# Altium integrated library ESP8266-Deskop_Power.IntLib: 35 symbols
Pins are listed as number, name and electrical type; pins without a type are passive.

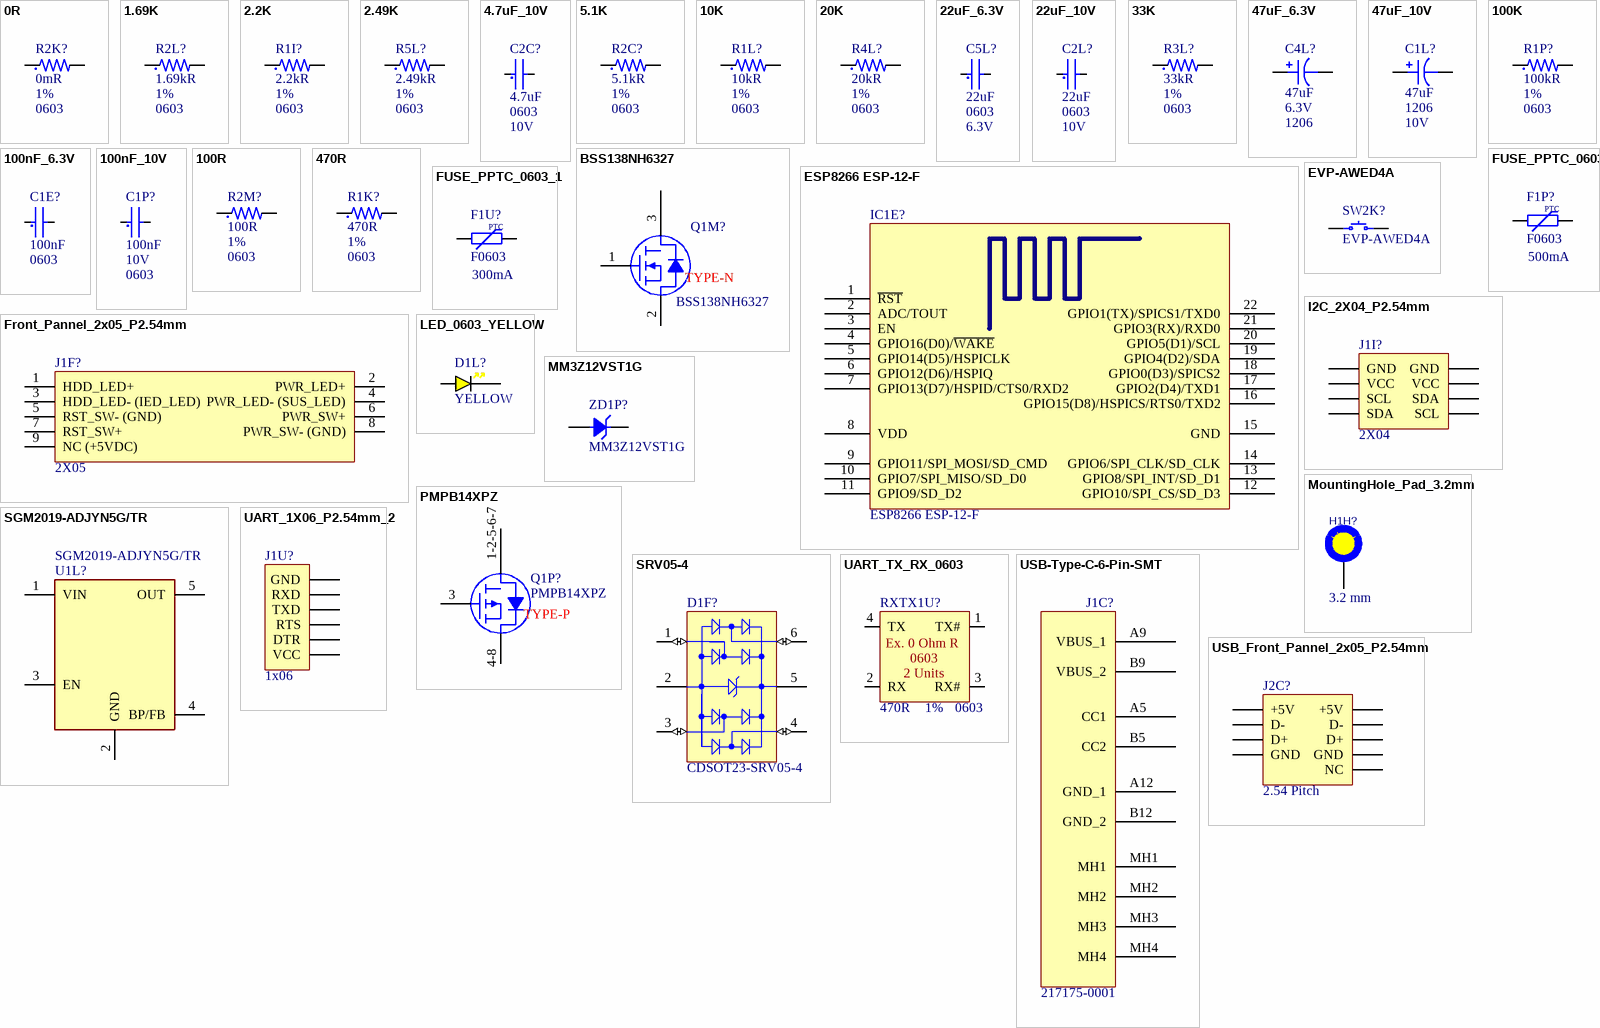
[diagram p0: symbols 0R to USB_Front_Pannel_2x05_P2.54mm]

## 0R
designator R2K?, comment value 0mR  Tolerance: 1%  Case/Package: 0603  (hidden comment: RC0603JR-070RL)
Zero Ohm Resistor, Jumper, 0603 [1608 Metric], Thick Film, 100 mW, 1 A, Surface Mount; Manufacturer: Yageo; Temperature Coefficient: 200ppm/°C; Power Rating: 100mW; Voltage Rating (DC): 50V; Resistance Tolerance: 5%; Supplier 1: Future Electronics; Manufacturer Part Number: RC0603JR-070RL; RoHS: Yes; Category: Chip SMD Resistors; Stock 1: 16355000; Pricing 1: 5000=0.0015, 50000=0.0014, 150000=0.0014, 375000=0.0013, 1000000=0.0012 (USD); Pins: 2; Case Code (Imperial): 0603; Case Code (Metric): 1608; Contact Plating: Tin,Matte; Min Operating Temperature: -55°C; Max Operating Temperature: 155°C; Packaging: Tape and Reel; Series: RC; Package Quantity: 5000; Termination: SMD/SMT; Voltage Rating: 50V; Resistor Type: Thick Film; Features: Moisture Resistant; Max Power Dissipation: 100mW; Number of Terminations: 2; Construction: Rectangular; Technology: THICK FILM; Length: 1.6mm; Width: 0.8mm; Height: 0.45mm; Depth: 0.8mm; RoHS Compliant: Yes; Reach SVHC Compliant: Unknown; Lead Free: 5697LeadFree; Military Standard: Not; Supplier Part Number 1: 3992146
footprint R0603-IPC_A
footprint R0603-IPC_B
footprint R0603-MFG
footprint R0603-IPC_C
footprint R0603-MFG_No_Silk
footprint R0603-IPC_C_No_Silk
footprint R0603-IPC_B_No_Silk
footprint R0603-IPC_A_No_Silk
pins: 1, 2

## 1.69K
designator R2L?, comment value 1.69kR  Tolerance: 1%  Case/Package: 0603  (hidden comment: MCR03EZPFX1691)
Surface Mount Thick Film Chip Resistor 0603 Case 1.69K Ohms 1% Tolerance 100 PPM; Manufacturer: Rohm; Power Rating: 100mW; Temperature Coefficient: 100ppm/°C; Voltage Rating (DC): 50V; Supplier 1: Quest; Manufacturer Part Number: MCR03EZPFX1691; RoHS: Yes; Category: Chip SMD Resistors; Stock 1: 11347; Pricing 1: 1=0.0232, 217=0.0145, 1380=0.0087, 5748=0.0044 (USD); Case Code (Imperial): 0603; Case Code (Metric): 1608; Min Operating Temperature: -55°C; Max Operating Temperature: 155°C; Packaging: Cut Tape; Number of Terminations: 2; Max Power Dissipation: 100mW; Features: Automotive AEC-Q200; Series: MCR03; Lead Free: Lead Free; RoHS Compliant: Yes; Supplier Part Number 1: MCR03EZPFX1691; Package Quantity: 1; Length: 0.063inch; Width: 0.031inch; Height: 0.022inch; Mounting Technology: Surface Mount; ComponentLink1URL: http://rohmfs.rohm.com/en/products/databook/datasheet/passive/resistor/chip_resistor/mcr.pdf?src-supplier=Avnet; ComponentLink1Description: http://rohmfs.rohm.com/en/products/databook/datasheet/passive/resistor/chip_resistor/mcr.pdf?src-supplier=Avnet; ComponentLink2URL: http://www.rohm.com/web/global/datasheet/MCR03EZPFX/mcr-e?src-supplier=Digikey; ComponentLink2Description: http://www.rohm.com/web/global/datasheet/MCR03EZPFX/mcr-e?src-supplier=Digikey
footprint R0603-IPC_A
footprint R0603-IPC_A_No_Silk
footprint R0603-IPC_B
footprint R0603-IPC_B_No_Silk
footprint R0603-IPC_C
footprint R0603-IPC_C_No_Silk
footprint R0603-MFG
footprint R0603-MFG_No_Silk
pins: 1, 2

## 2.2K
designator R1I?, comment value 2.2kR  Tolerance: 1%  Case/Package: 0603  (hidden comment: RC0603FR-072K2L)
SMD Chip Resistor, 2.2 kOhm, ± 1%, 100 mW, 0603 [1608 Metric], Thick Film, General Purpose; Manufacturer: Yageo; Power Rating: 100mW; Voltage Rating: 50V; Temperature Coefficient: 100ppm/°C; Supplier 1: Future Electronics; Manufacturer Part Number: RC0603FR-072K2L; RoHS: Yes; Category: Chip SMD Resistors; Stock 1: 6755000; Pricing 1: 5000=0.0026, 75000=0.001, 100000=0.0024, 200000=0.001, 375000=0.0023, 500000=0.0009, 1250000=0.0022, 5000000=0.002 (USD); Case Code (Imperial): 0603; Case Code (Metric): 1608; Min Operating Temperature: -55°C; Max Operating Temperature: 155°C; Packaging: Tape and Reel; Resistor Type: Thick Film; Number of Terminations: 2; Max Power Dissipation: 100mW; Features: Moisture Resistant; Series: RC; Resistance Tolerance: 1%; Lead Free: Lead Free; RoHS Compliant: Yes; Reach SVHC Compliant: Unknown; ComponentLink1URL: https://datasheet.ciiva.com/2453/pyu-r-int-thick-7-2453943.pdf?src-supplier=Digikey; ComponentLink1Description: https://datasheet.ciiva.com/2453/pyu-r-int-thick-7-2453943.pdf?src-supplier=Digikey; ComponentLink2URL: https://datasheet.ciiva.com/2453/pyu-r-int-thick-7-2453944.pdf?src-supplier=Digikey; ComponentLink2Description: https://datasheet.ciiva.com/2453/pyu-r-int-thick-7-2453944.pdf?src-supplier=Digikey; ComponentLink3URL: https://datasheet.ciiva.com/2453/pyu-r-int-thick-7-2453945.pdf?src-supplier=Digikey; ComponentLink3Description: https://datasheet.ciiva.com/2453/pyu-r-int-thick-7-2453945.pdf?src-supplier=Digikey; ComponentLink4URL: https://datasheet.ciiva.com/7660/1868787-7660791.pdf?src-supplier=Element14; ComponentLink4Description: https://datasheet.ciiva.com/7660/1868787-7660791.pdf?src-supplier=Element14; ComponentLink5URL: https://datasheet.ciiva.com/46394/443971-46394958.pdf?src-supplier=Element14; ComponentLink5Description: https://datasheet.ciiva.com/46394/443971-46394958.pdf?src-supplier=Element14; Supplier Part Number 1: 6372452
footprint R0603-IPC_A
footprint R0603-IPC_B
footprint R0603-IPC_C
footprint R0603-MFG
footprint R0603-MFG_No_Silk
footprint R0603-IPC_C_No_Silk
footprint R0603-IPC_B_No_Silk
footprint R0603-IPC_A_No_Silk
pins: 1, 2

## 2.49K
designator R5L?, comment value 2.49kR  Tolerance: 1%  Case/Package: 0603  (hidden comment: MCR03EZPFX2491)
Res Thick Film 0603 2.49K Ohm 1% 1/10W ±100ppm/°C Molded SMD SMD Paper T/R; Manufacturer: Rohm; Power Rating: 100mW; Voltage Rating (DC): 50V; Supplier 1: One Stop Electro; Manufacturer Part Number: MCR03EZPFX2491; RoHS: Yes; Category: Chip SMD Resistors; Stock 1: 683; Pricing 1: 1=0.036, 10=0.031, 100=0.031, 1000=0.028 (USD); Case Code (Imperial): 0603; Case Code (Metric): 1608; Min Operating Temperature: -55°C; Max Operating Temperature: 155°C; Packaging: Cut Tape; Number of Terminations: 2; Temperature Coefficient: 100ppm/°C; Max Power Dissipation: 100mW; Features: Automotive AEC-Q200; Series: MCR03; Lead Free: Lead Free; RoHS Compliant: Yes; ComponentLink1URL: https://datasheet.ciiva.com/2520/mcr-2520347.pdf?src-supplier=Digikey; ComponentLink1Description: https://datasheet.ciiva.com/2520/mcr-2520347.pdf?src-supplier=Digikey; ComponentLink2URL: https://datasheet.ciiva.com/2520/mcr-2520348.pdf?src-supplier=Digikey; ComponentLink2Description: https://datasheet.ciiva.com/2520/mcr-2520348.pdf?src-supplier=Digikey; ComponentLink3URL: https://datasheet.ciiva.com/2520/mcr-2520349.pdf?src-supplier=Digikey; ComponentLink3Description: https://datasheet.ciiva.com/2520/mcr-2520349.pdf?src-supplier=Digikey; ComponentLink4URL: https://datasheet.ciiva.com/16203/mcr03ezpd-16203167.pdf?src-supplier=Future+Electronics; ComponentLink4Description: https://datasheet.ciiva.com/16203/mcr03ezpd-16203167.pdf?src-supplier=Future+Electronics; Supplier Part Number 1: 53268691; Mounting Technology: Surface Mount; Contact Plating: Tin; Package Quantity: 1; Length: 0.063inch; Width: 0.031inch; Height: 0.022inch
footprint R0603-MFG
footprint R0603-IPC_C
footprint R0603-IPC_B
footprint R0603-IPC_A
footprint R0603-MFG_No_Silk
footprint R0603-IPC_C_No_Silk
footprint R0603-IPC_B_No_Silk
footprint R0603-IPC_A_No_Silk
pins: 1, 2

## 4.7uF_10V
designator C2C?, comment value 4.7uF  Case Code (Imperial): 0603  Voltage Rating: 10V  (hidden comment: CL10A475KP8NNNC)
Multilayer Ceramic Capacitor, 4.7 uF, 10 V, ± 10%, X5R, 0603 [1608 Metric]; Manufacturer: Samsung; Supplier 1: Verical; Manufacturer Part Number: CL10A475KP8NNNC; RoHS: Yes; Category: Ceramic Capacitors; Mounting Technology: Surface Mount; Case/Package: 0603; Case Code (Metric): 1608; Min Operating Temperature: -55°C; Max Operating Temperature: 85°C; Packaging: Tape and Reel; Tolerance: 10%; Series: CL; Length: 1.6mm; Width: 0.031inch; RoHS Compliant: Yes; Supplier Part Number 1: CL10A475KP8NNNC; Stock 1: 412000; Pricing 1: 4000=0.0042 (USD); Package Quantity: 1; Voltage Rating (DC): 10V; Dielectric: X5R; Construction: Flat; Height: 0.8mm; Depth: 0.8mm; Thickness: 0.035inch; Radiation Hardening: No
footprint C0603-IPC_A
footprint C0603-IPC_B
footprint C0603-IPC_C
footprint C0603-MFG
footprint C0603-MFG_No_Silk
footprint C0603-IPC_C_No_Silk
footprint C0603-IPC_B_No_Silk
footprint C0603-IPC_A_No_Silk
pins: 1, 2

## 5.1K
designator R2C?, comment value 5.1kR  Tolerance: 1%  Case/Package: 0603  (hidden comment: CRCW06035K10FKEA)
SMD Chip Resistor, 5.1 kOhm, ± 1%, 100 mW, 0603 [1608 Metric], Thick Film, General Purpose; Manufacturer: Vishay; Temperature Coefficient: 100ppm/°C; Max Power Dissipation: 100mW; Voltage Rating: 75V; Supplier 1: Mouser; Manufacturer Part Number: CRCW06035K10FKEA; RoHS: Yes; Category: Chip SMD Resistors; Stock 1: 43654; Pricing 1: 1=0.1, 10=0.034, 50=0.034, 100=0.014, 1000=0.008, 10000=0.004 (USD); Case Code (Imperial): 0603; Case Code (Metric): 1608; Min Operating Temperature: -55°C; Max Operating Temperature: 155°C; Packaging: Tape and Reel; Series: CRCW; Number of Terminations: 2; Voltage Rating (DC): 75V; Package Quantity: 5000; Length: 1.55mm; Width: 0.85mm; Height: 0.45mm; RoHS Compliant: Yes; ComponentLink1URL: https://datasheet.ciiva.com/11809/0900766b80d98afc-11809935.pdf?src-supplier=Rs; ComponentLink1Description: https://datasheet.ciiva.com/11809/0900766b80d98afc-11809935.pdf?src-supplier=Rs; ComponentLink2URL: https://datasheet.ciiva.com/7690/1720486-7690873.pdf?src-supplier=Element14; ComponentLink2Description: https://datasheet.ciiva.com/7690/1720486-7690873.pdf?src-supplier=Element14; ComponentLink3URL: https://datasheet.ciiva.com/15159/getdatasheetpartid-32793-15159338.pdf?src-supplier=Verical; ComponentLink3Description: https://datasheet.ciiva.com/15159/getdatasheetpartid-32793-15159338.pdf?src-supplier=Verical; Supplier Part Number 1: 71-CRCW0603-5.1K-E3; Weight: 7.1E-05oz; Contact Plating: Tin; Features: Automotive AEC-Q200; Power Rating: 100mW; Termination: SMD/SMT; Resistor Type: Thick Film; Construction: Rectangular; Resistance Tolerance: 1%; Technology: THICK FILM; Depth: 0.85mm; Radiation Hardening: No; Lead Free: 5697LeadFree; Military Standard: Not; Reach SVHC Compliant: Unknown; ComponentLink4URL: https://datasheet.ciiva.com/26314/fld-crcw-e3-data-en-26314742.pdf?src-supplier=Distrelec; ComponentLink4Description: https://datasheet.ciiva.com/26314/fld-crcw-e3-data-en-26314742.pdf?src-supplier=Distrelec; ComponentLink5URL: https://datasheet.ciiva.com/7690/1697337-7690728.pdf?src-supplier=Element14; ComponentLink5Description: https://datasheet.ciiva.com/7690/1697337-7690728.pdf?src-supplier=Element14; ComponentLink6URL: https://datasheet.ciiva.com/3257/dcrcwe3-3257758.pdf?src-supplier=Avnet; ComponentLink6Description: https://datasheet.ciiva.com/3257/dcrcwe3-3257758.pdf?src-supplier=Avnet; ComponentLink7URL: https://datasheet.ciiva.com/16226/dcrcwe3-16226862.pdf?src-supplier=Future+Electronics; ComponentLink7Description: https://datasheet.ciiva.com/16226/dcrcwe3-16226862.pdf?src-supplier=Future+Electronics
footprint R0603-IPC_A
footprint R0603-IPC_B
footprint R0603-IPC_C
footprint R0603-MFG
footprint R0603-MFG_No_Silk
footprint R0603-IPC_C_No_Silk
footprint R0603-IPC_B_No_Silk
footprint R0603-IPC_A_No_Silk
pins: 1, 2

## 10K
designator R1L?, comment value 10kR  Tolerance: 1%  Case/Package: 0603  (hidden comment: RC0603FR-0710KL)
SMD Chip Resistor, 10 kOhm, ± 1%, 100 mW, 0603 [1608 Metric], Thick Film, General Purpose; Manufacturer: Yageo; Power Rating: 100mW; Temperature Coefficient: 100ppm/°C; Voltage Rating (DC): 50V; Voltage Rating: 75V; Supplier 1: Future Electronics; Manufacturer Part Number: RC0603FR-0710KL; RoHS: Yes; Category: Chip SMD Resistors; Stock 1: 44660000; Pricing 1: 5000=0.0015, 50000=0.0014, 150000=0.0014, 375000=0.0013, 1000000=0.0012 (USD); Case Code (Imperial): 0603; Case Code (Metric): 1608; Min Operating Temperature: -55°C; Max Operating Temperature: 155°C; Packaging: Tape and Reel; Number of Terminations: 2; Max Power Dissipation: 100mW; Features: Moisture Resistant; Series: RC; Lead Free: 5697LeadFree; RoHS Compliant: Yes; Supplier Part Number 1: 4023214; Length: 1.6mm; Width: 0.8mm; Height: 0.45mm; Pins: 2; Weight: 7.1E-05oz; Resistance Tolerance: 1%; Termination: SMD/SMT; Resistor Type: Thick Film; Construction: Rectangular; Depth: 0.8mm; Lead Pitch: 0.3mm; Reach SVHC Compliant: No; Military Standard: Not
footprint R0603-IPC_A
footprint R0603-IPC_B
footprint R0603-IPC_C
footprint R0603-MFG
footprint R0603-MFG_No_Silk
footprint R0603-IPC_C_No_Silk
footprint R0603-IPC_B_No_Silk
footprint R0603-IPC_A_No_Silk
pins: 1, 2

## 20K
designator R4L?, comment value 20kR  Tolerance: 1%  Case/Package: 0603  (hidden comment: CR0603-FX-2002ELF)
SMD Chip Resistor, 20 kOhm, ± 1%, 100 mW, 0603 [1608 Metric], Thick Film, General Purpose; Manufacturer: Bourns; Power Rating: 100mW; Temperature Coefficient: 100ppm/°C; Voltage Rating (DC): 50V; Supplier 1: Onlinecomponents.com; Manufacturer Part Number: CR0603-FX-2002ELF; RoHS: Yes; Category: Chip SMD Resistors; Stock 1: 20000; Pricing 1: 20000=0.0014, 40000=0.0013, 80000=0.0013, 160000=0.0012 (USD); Case Code (Imperial): 0603; Case Code (Metric): 1608; Min Operating Temperature: -55°C; Max Operating Temperature: 155°C; Packaging: Tape and Reel; Number of Terminations: 2; Max Power Dissipation: 100mW; Features: Moisture Resistant; Series: CR0603; RoHS Compliant: Yes; ComponentLink1URL: https://datasheet.ciiva.com/11809/0900766b80fcdb72-11809666.pdf?src-supplier=Rs; ComponentLink1Description: https://datasheet.ciiva.com/11809/0900766b80fcdb72-11809666.pdf?src-supplier=Rs; ComponentLink2URL: https://datasheet.ciiva.com/9121/chpreztr-9121928.pdf?src-supplier=Avnet; ComponentLink2Description: https://datasheet.ciiva.com/9121/chpreztr-9121928.pdf?src-supplier=Avnet; Supplier Part Number 1: CR0603-FX-2002ELF; Mounting Technology: Surface Mount; Contact Plating: Tin; Package Quantity: 1; Length: 1.6mm; Width: 0.8mm; Height: 0.45mm; Voltage Rating: 50V; Resistor Type: Thick Film; Termination: SMD/SMT; Resistance Tolerance: 1%; Technology: THICK FILM; Depth: 0.8mm; Thickness: 457um; Radiation Hardening: No; Reach SVHC Compliant: No
footprint R0603-IPC_A
footprint R0603-IPC_B
footprint R0603-IPC_C
footprint R0603-MFG
footprint R0603-MFG_No_Silk
footprint R0603-IPC_C_No_Silk
footprint R0603-IPC_B_No_Silk
footprint R0603-IPC_A_No_Silk
pins: 1, 2

## 22uF_6.3V
designator C5L?, comment value 22uF  Case/Package: 0603  Voltage Rating: 6.3V  (hidden comment: GRM188R60J226MEA0D)
Multilayer Ceramic Capacitor, 22 uF, 6.3 V, ± 20%, X5R, 0603 [1608 Metric]; Manufacturer: Murata; Material: 4241ConductorMaterial; Supplier 1: Mouser; Manufacturer Part Number: GRM188R60J226MEA0D; RoHS: Yes; Category: Ceramic Capacitors; Stock 1: 856547; Pricing 1: 1=0.2, 10=0.078, 50=0.078, 100=0.045, 1000=0.04, 10000=0.033 (USD); Mounting Technology: Surface Mount; Pins: 2NUMBER; Case Code (Metric): 1608; Weight: 0.000222oz; Min Operating Temperature: -55°C; Max Operating Temperature: 85°C; Tolerance: 20%; Series: GRM; Packaging: Tape and Reel; Dielectric: X5R; Voltage Rating (DC): 6.3V; Package Quantity: 1; Termination: SMD/SMT; Length: 0.063inch; Width: 0.031inch; Height: 0.8mm; Thickness: 0.039inch; RoHS Compliant: Yes; Reach SVHC Compliant: No; Lead Free: 5697LeadFree; ComponentLink1URL: https://datasheet.ciiva.com/29540/partnumbering-e-01-29540442.pdf?src-supplier=Digikey; ComponentLink1Description: https://datasheet.ciiva.com/29540/partnumbering-e-01-29540442.pdf?src-supplier=Digikey; ComponentLink2URL: https://datasheet.ciiva.com/29540/partnumbering-e-01-29540441.pdf?src-supplier=Digikey; ComponentLink2Description: https://datasheet.ciiva.com/29540/partnumbering-e-01-29540441.pdf?src-supplier=Digikey; ComponentLink3URL: https://datasheet.ciiva.com/29540/partnumbering-e-01-29540443.pdf?src-supplier=Digikey; ComponentLink3Description: https://datasheet.ciiva.com/29540/partnumbering-e-01-29540443.pdf?src-supplier=Digikey; Supplier Part Number 1: 81-GRM188R60J226ME0D; Case Code (Imperial): 0603
footprint C0603-IPC_A
footprint C0603-IPC_B
footprint C0603-IPC_C
footprint C0603-MFG
footprint C0603-MFG_No_Silk
footprint C0603-IPC_C_No_Silk
footprint C0603-IPC_B_No_Silk
footprint C0603-IPC_A_No_Silk
pins: 1, 2

## 22uF_10V
designator C2L?, comment value 22uF  Case/Package: 0603  Voltage Rating: 10V  (hidden comment: GRM188R61A226ME15D)
Multilayer Ceramic Capacitor, 22 uF, 10 V, ± 20%, X5R, 0603 [1608 Metric]; Manufacturer: Murata; Supplier 1: Mouser; Manufacturer Part Number: GRM188R61A226ME15D; RoHS: Yes; Category: Ceramic Capacitors; Pricing 1: 1=0.2, 10=0.088, 50=0.088, 100=0.051, 1000=0.041, 10000=0.037 (USD); Mounting Technology: Surface Mount; Case Code (Imperial): 0603; Case Code (Metric): 1608; Min Operating Temperature: -55°C; Max Operating Temperature: 85°C; Packaging: Cut Tape; Dielectric: X5R; Package Quantity: 4000; Series: GRM; Termination: SMD/SMT; Voltage Rating (DC): 10V; Length: 1.6mm; Width: 0.8mm; Height: 0.8mm; RoHS Compliant: Yes; Lead Free: 5697LeadFree; ComponentLink1URL: https://datasheet.ciiva.com/46444/1769893-46444975.pdf?src-supplier=Element14; ComponentLink1Description: https://datasheet.ciiva.com/46444/1769893-46444975.pdf?src-supplier=Element14; Supplier Part Number 1: 81-GRM188R61A226ME5D; Tolerance: 20%; Stock 1: 596743; Material: Ceramic; Weight: 0.000222oz; Thickness: 0.039inch; Reach SVHC Compliant: No
footprint C0603-IPC_A
footprint C0603-IPC_C
footprint C0603-MFG
footprint C0603-IPC_B
footprint C0603-MFG_No_Silk
footprint C0603-IPC_C_No_Silk
footprint C0603-IPC_B_No_Silk
footprint C0603-IPC_A_No_Silk
pins: 1, 2

## 33K
designator R3L?, comment value 33kR  Tolerance: 1%  Case/Package: 0603  (hidden comment: ERJ-3EKF3302V)
Res Thick Film 0603 33K Ohm 1% 0.1W(1/10W) ±100ppm/C Pad SMD Automotive T/R; Manufacturer: Panasonic; Power Rating: 100mW; Temperature Coefficient: 100ppm/°C; Voltage Rating (DC): 75V; Supplier 1: Onlinecomponents.com; Manufacturer Part Number: ERJ-3EKF3302V; RoHS: Yes; Category: Chip SMD Resistors; Stock 1: 350000; Pricing 1: 5000=0.0041, 10000=0.0039, 20000=0.0037, 40000=0.0036, 50000=0.0035 (USD); Case Code (Imperial): 0603; Case Code (Metric): 1608; Min Operating Temperature: -55°C; Max Operating Temperature: 155°C; Packaging: Tape and Reel; Number of Terminations: 2; Max Power Dissipation: 100mW; Features: Automotive AEC-Q200; Series: ERJ; Lead Free: 5697LeadFree; RoHS Compliant: Yes; Supplier Part Number 1: ERJ3EKF3302V; Mounting Technology: Surface Mount; Contact Plating: Tin; Package Quantity: 1; Length: 1.6mm; Width: 0.8mm; Height: 0.022inch; Pins: 2; Voltage Rating: 75V; Termination: SMD/SMT; Construction: Rectangular; Resistor Type: Thick Film; Resistance Tolerance: 1%; Depth: 0.8mm; Radiation Hardening: No; Military Standard: Not; Reach SVHC Compliant: No
footprint R0603-IPC_A
footprint R0603-IPC_B
footprint R0603-IPC_C
footprint R0603-MFG
footprint R0603-MFG_No_Silk
footprint R0603-IPC_C_No_Silk
footprint R0603-IPC_B_No_Silk
footprint R0603-IPC_A_No_Silk
pins: 1, 2

## 47uF_6.3V
designator C4L?, comment value 47uF  Voltage: 6.3V  Size: 1206  (hidden comment: T491A476M006AT)
47uF Solid MnO2 Tantalum Electrolytic Capacitor; 6.3 V dc +/-20%; T491 Series; Manufacturer: KEMET; Supplier 1: Mouser; RoHS: Yes; Category: Tantalum Capacitors; ComponentLink1URL: https://datasheet.ciiva.com/18096/getdatasheetpartid-132583-18096186.pdf?src-supplier=Verical; ComponentLink1Description: https://datasheet.ciiva.com/18096/getdatasheetpartid-132583-18096186.pdf?src-supplier=Verical; ComponentLink2URL: https://datasheet.ciiva.com/258/kem-t2005-t491-258163.pdf?src-supplier=Digikey; ComponentLink2Description: https://datasheet.ciiva.com/258/kem-t2005-t491-258163.pdf?src-supplier=Digikey; ComponentLink3URL: https://datasheet.ciiva.com/258/kem-t2005-t491-258164.pdf?src-supplier=Digikey; ComponentLink3Description: https://datasheet.ciiva.com/258/kem-t2005-t491-258164.pdf?src-supplier=Digikey; ComponentLink4URL: https://datasheet.ciiva.com/258/kem-t2005-t491-258165.pdf?src-supplier=Digikey; ComponentLink4Description: https://datasheet.ciiva.com/258/kem-t2005-t491-258165.pdf?src-supplier=Digikey; ComponentLink5URL: https://datasheet.ciiva.com/12883/kem-t2005-t491-12883464.pdf?src-supplier=Mouser; ComponentLink5Description: https://datasheet.ciiva.com/12883/kem-t2005-t491-12883464.pdf?src-supplier=Mouser; ComponentLink6URL: https://datasheet.ciiva.com/14103/t491serie-eng-tds-14103966.pdf?src-supplier=Distrelec; ComponentLink6Description: https://datasheet.ciiva.com/14103/t491serie-eng-tds-14103966.pdf?src-supplier=Distrelec; ComponentLink7URL: https://datasheet.ciiva.com/28561/kem-t2005-t491-28561180.pdf?src-supplier=Element14; ComponentLink7Description: https://datasheet.ciiva.com/28561/kem-t2005-t491-28561180.pdf?src-supplier=Element14; ComponentLink8URL: https://datasheet.ciiva.com/7851/1854511-7851173.pdf?src-supplier=Element14; ComponentLink8Description: https://datasheet.ciiva.com/7851/1854511-7851173.pdf?src-supplier=Element14; ComponentLink9URL: https://datasheet.ciiva.com/7851/1854511-7851174.pdf?src-supplier=Element14; ComponentLink9Description: https://datasheet.ciiva.com/7851/1854511-7851174.pdf?src-supplier=Element14; Manufacturer Part Number: T491A476M006AT; Stock 1: 52790; Pricing 1: 1=0.58, 10=0.394, 50=0.394, 100=0.259, 1000=0.172, 10000=0.139 (USD); Supplier Part Number 1: 80-T491A476M06
footprint CAP POL 1206_3216 (Molded Capacitor, 2-Leads, Body 3.20x1.6mm, IPC Medium Density)
footprint CAP POL 1206_3216-MFG
pins: 1, 2

## 47uF_10V
designator C1L?, comment value 47uF  Case/Package: 1206  Voltage Rating (DC): 10V  (hidden comment: TCTAL1A476M8R)
Surface Mount Tantalum Capacitor, 47 uF, 10 V, ± 20%, -55 °C, 125 °C, 1206 [3216-12 Metric]; Manufacturer: Rohm; Supplier 1: Ameya360; RoHS: Yes; Category: Tantalum Capacitors; ComponentLink1URL: https://datasheet.ciiva.com/258/tct-al-258880.pdf?src-supplier=Digikey; ComponentLink1Description: https://datasheet.ciiva.com/258/tct-al-258880.pdf?src-supplier=Digikey; ComponentLink2URL: https://datasheet.ciiva.com/258/tct-al-258881.pdf?src-supplier=Digikey; ComponentLink2Description: https://datasheet.ciiva.com/258/tct-al-258881.pdf?src-supplier=Digikey; ComponentLink3URL: https://datasheet.ciiva.com/258/tct-al-258879.pdf?src-supplier=Digikey; ComponentLink3Description: https://datasheet.ciiva.com/258/tct-al-258879.pdf?src-supplier=Digikey; ComponentLink4URL: https://datasheet.ciiva.com/16394/tct-al-16394319.pdf?src-supplier=Future+Electronics; ComponentLink4Description: https://datasheet.ciiva.com/16394/tct-al-16394319.pdf?src-supplier=Future+Electronics; Manufacturer Part Number: TCTAL1A476M8R; Stock 1: 250; Pricing 1: 1=0.82, 10=0.622 (USD); Supplier Part Number 1: TCTAL1A476M8R; Mounting Technology: Surface Mount; Case Code (Metric): 3216; Case Code (Imperial): 1206; Min Operating Temperature: -55°C; Max Operating Temperature: 125°C; Tolerance: 20%; Packaging: Cut Tape; Voltage Rating: 10V; Series: TCT; Features: General Purpose; Construction: Flat; Length: 3.2mm; Height: 1.1mm; Depth: 1.6mm; Radiation Hardening: No; RoHS Compliant: Yes; Lead Free: Lead Free
footprint CAP POL 1206_3216 (Molded Capacitor, 2-Leads, Body 3.20x1.6mm, IPC Medium Density)
footprint CAP POL 1206_3216-MFG
pins: 1, 2

## 100K
designator R1P?, comment value 100kR  Tolerance: 1%  Case/Package: 0603  (hidden comment: AC0603FR-07100KL)
SMD Chip Resistor, 100 kOhm, ± 1%, 100 mW, 0603 [1608 Metric], Thick Film, General Purpose; Manufacturer: Yageo; Power Rating: 100mW; Temperature Coefficient: 100ppm/°C; Voltage Rating: 50V; Working Voltage: 75V; Supplier 1: Future Electronics; Manufacturer Part Number: AC0603FR-07100KL; RoHS: Yes; Category: Chip SMD Resistors; Stock 1: 3790000; Pricing 1: 5000=0.0034, 25000=0.0018, 75000=0.0032, 125000=0.0017, 250000=0.0031, 750000=0.003, 2500000=0.0027 (USD); Case Code (Imperial): 0603; Case Code (Metric): 1608; Min Operating Temperature: -55°C; Max Operating Temperature: 155°C; Packaging: Tape and Reel; Series: AC; Termination: SMD/SMT; Construction: Rectangular; Length: 1.6mm; Depth: 0.8mm; RoHS Compliant: Yes; Military Standard: Not; Lead Free: 5697LeadFree; Supplier Part Number 1: 6029288; Max Power Dissipation: 100mW; Features: Moisture Resistant,Automotive AEC-Q200; Number of Terminations: 2; Technology: THICK FILM; Moisture Sensitivity Level: 1; Ratings: AEC-Q200; ComponentLink1URL: https://datasheet.ciiva.com/26862/getdatasheetpartid-715379-26862460.pdf?src-supplier=Verical; ComponentLink1Description: https://datasheet.ciiva.com/26862/getdatasheetpartid-715379-26862460.pdf?src-supplier=Verical; ComponentLink2URL: https://datasheet.ciiva.com/5562/pyu-ac-51-rohs-l-2-5562536.pdf?src-supplier=Mouser; ComponentLink2Description: https://datasheet.ciiva.com/5562/pyu-ac-51-rohs-l-2-5562536.pdf?src-supplier=Mouser
footprint R0603-IPC_A
footprint R0603-MFG
footprint R0603-IPC_C
footprint R0603-IPC_B
footprint R0603-MFG_No_Silk
footprint R0603-IPC_C_No_Silk
footprint R0603-IPC_B_No_Silk
footprint R0603-IPC_A_No_Silk
pins: 1, 2

## 100nF_6.3V
designator C1E?, comment value 100nF  Package: 0603  (hidden comment: KGM15AR70J104KM)
Cap Cer 0.1UF 6.3V X7R 0603; Manufacturer: KYOCERA AVX; Tol: 10%; Supplier 1: Digikey; Supplier Part Number 1: 478-KGM15AR70J104KMCT-ND; Manufacturer Part Number: KGM15AR70J104KM; Category: Ceramic Capacitors; Stock 1: 117167; Pricing 1: 1=0.1, 10=0.032, 50=0.0186, 100=0.0144, 500=0.01082, 1000=0.0085, 2500=0.00772, 5000=0.00711 (USD); Voltage: 6.3V
footprint C0603-IPC_A
footprint C0603-IPC_B
footprint C0603-IPC_C
footprint C0603-MFG
footprint C0603-MFG_No_Silk
footprint C0603-IPC_C_No_Silk
footprint C0603-IPC_B_No_Silk
footprint C0603-IPC_A_No_Silk
pins: 1, 2

## 100nF_10V
designator C1P?, comment value 100nF  Voltage Rating (DC): 10V  Case/Package: 0603  (hidden comment: C0603C104K8RACTU)
Multilayer Ceramic Capacitor, 0.1 uF, 10 V, ± 10%, X7R, 0603 [1608 Metric]; Manufacturer: KEMET; Temperature Coefficient: 30ppm/°C; Material: 4241ConductorMaterial; Dissipation Factor: 5%; Manufacturer Part Number: C0603C104K8RACTU; Min Operating Temperature: -55°C; Max Operating Temperature: 125°C; Dielectric: X7R; Tolerance: 10%; Voltage Rating: 10V; Packaging: Tape and Reel; Series: C; Length: 1.6mm; Height: 0.8mm; Depth: 0.8mm; Case Code (Metric): 1608; Case Code (Imperial): 0603; Dielectric Material: Ceramic; Package Quantity: 1; Termination: SMD/SMT; Width: 0.031inch; Thickness: 0.034inch; Supplier 1: Mouser; RoHS: Yes; Category: Ceramic Capacitors; Stock 1: 246409; Pricing 1: 1=0.11, 10=0.075, 50=0.075, 100=0.036, 1000=0.021, 10000=0.017 (USD); Mounting Technology: Surface Mount,PCB; Construction: Flat; Lead Pitch: 0.7mm; Reach SVHC Compliant: No; ComponentLink1URL: https://datasheet.ciiva.com/6093/1776114-6093269.pdf?src-supplier=Farnell; ComponentLink1Description: https://datasheet.ciiva.com/6093/1776114-6093269.pdf?src-supplier=Farnell; Supplier Part Number 1: 80-C0603C104K8R; Pins: 2; Voltage: 10V; Radiation Hardening: No; RoHS Compliant: Yes; Lead Free: 5697LeadFree; ComponentLink2URL: https://datasheet.ciiva.com/7823/kem-c1002-x7r-smd-7823989.pdf?src-supplier=Element14; ComponentLink2Description: https://datasheet.ciiva.com/7823/kem-c1002-x7r-smd-7823989.pdf?src-supplier=Element14; ComponentLink3URL: https://datasheet.ciiva.com/22693/1851736-22693967.pdf?src-supplier=Element14; ComponentLink3Description: https://datasheet.ciiva.com/22693/1851736-22693967.pdf?src-supplier=Element14; ComponentLink4URL: https://datasheet.ciiva.com/14589/70095383-14589402.pdf?src-supplier=Allied+Electronics; ComponentLink4Description: https://datasheet.ciiva.com/14589/70095383-14589402.pdf?src-supplier=Allied+Electronics; ComponentLink5URL: https://datasheet.ciiva.com/14593/70095383-14593978.pdf?src-supplier=Allied+Electronics; ComponentLink5Description: https://datasheet.ciiva.com/14593/70095383-14593978.pdf?src-supplier=Allied+Electronics; ComponentLink6URL: https://datasheet.ciiva.com/5419/kem-c1002-x7r-smd-357932-5419657.pdf?src-supplier=Mouser; ComponentLink6Description: https://datasheet.ciiva.com/5419/kem-c1002-x7r-smd-357932-5419657.pdf?src-supplier=Mouser; ComponentLink7URL: https://datasheet.ciiva.com/18192/getdatasheetpartid-91529-18192711.pdf?src-supplier=Verical; ComponentLink7Description: https://datasheet.ciiva.com/18192/getdatasheetpartid-91529-18192711.pdf?src-supplier=Verical
footprint C0603-IPC_A
footprint C0603-IPC_B
footprint C0603-IPC_C
footprint C0603-MFG
footprint C0603-MFG_No_Silk
footprint C0603-IPC_C_No_Silk
footprint C0603-IPC_B_No_Silk
footprint C0603-IPC_A_No_Silk
pins: 1, 2

## 100R
designator R2M?, comment value 100R  Tolerance: 1%  Case/Package: 0603  (hidden comment: AC0603FR-07100RL)
SMD Chip Resistor, 100 Ohm, ± 1%, 100 mW, 0603 [1608 Metric], Thick Film, General Purpose; Manufacturer: Yageo; Power Rating: 100mW; Voltage Rating: 50V; Temperature Coefficient: 100ppm/°C; Supplier 1: Future Electronics; Manufacturer Part Number: AC0603FR-07100RL; RoHS: Yes; Category: Chip SMD Resistors; Stock 1: 1675000; Pricing 1: 5000=0.0027, 50000=0.0025, 150000=0.0024, 375000=0.0023, 1000000=0.0022 (USD); Case Code (Metric): 1608; Contact Plating: Tin,Matte; Min Operating Temperature: -55°C; Max Operating Temperature: 155°C; Packaging: Tape and Reel; Height: 0.45mm; RoHS Compliant: Yes; ComponentLink1URL: https://datasheet.ciiva.com/12576/pyu-ac-51-rohs-l-2-12576586.pdf?src-supplier=Mouser; ComponentLink1Description: https://datasheet.ciiva.com/12576/pyu-ac-51-rohs-l-2-12576586.pdf?src-supplier=Mouser; Supplier Part Number 1: 2026405; Case Code (Imperial): 0603; Series: AC; Termination: SMD/SMT; Length: 1.6mm; Width: 0.8mm; Weight: 7.1E-05oz; Number of Terminations: 2; Max Power Dissipation: 100mW; Features: Moisture Resistant,Automotive AEC-Q200; Ratings: AEC-Q200; Lead Free: 5697LeadFree
footprint R0603-IPC_A
footprint R0603-IPC_B
footprint R0603-IPC_C
footprint R0603-MFG
footprint R0603-MFG_No_Silk
footprint R0603-IPC_C_No_Silk
footprint R0603-IPC_B_No_Silk
footprint R0603-IPC_A_No_Silk
pins: 1, 2

## 470R
designator R1K?, comment value 470R  Tolerance: 1%  Case/Package: 0603  (hidden comment: ERJ-3EKF4700V)
SMD Chip Resistor, 470 Ohm, ± 1%, 100 mW, 0603 [1608 Metric], Thick Film, Precision; Manufacturer: Panasonic; Power Rating: 100mW; Voltage Rating: 75V; Temperature Coefficient: 100ppm/°C; Supplier 1: Onlinecomponents.com; Manufacturer Part Number: ERJ-3EKF4700V; RoHS: Yes; Category: Chip SMD Resistors; Stock 1: 230000; Pricing 1: 5000=0.0041, 10000=0.0039, 20000=0.0037, 40000=0.0036, 50000=0.0035 (USD); Mounting Technology: Surface Mount; Pins: 2; Case Code (Metric): 1608; Case Code (Imperial): 0603; Contact Plating: Tin; Min Operating Temperature: -55°C; Max Operating Temperature: 155°C; Packaging: Tape and Reel; Resistor Type: Thick Film; Termination: SMD/SMT; Series: ERJ; Resistance Tolerance: 1%; Package Quantity: 5000; Number of Terminations: 2; Max Power Dissipation: 100mW; Voltage Rating (DC): 75V; Features: Automotive AEC-Q200; Construction: Rectangular; Length: 1.6mm; Width: 0.8mm; Height: 0.45mm; Depth: 0.8mm; Radiation Hardening: No; Reach SVHC Compliant: No; Military Standard: Not; Lead Free: Lead Free; RoHS Compliant: Yes; Supplier Part Number 1: ERJ-3EKF4700V
footprint R0603-IPC_A
footprint R0603-IPC_B
footprint R0603-IPC_C
footprint R0603-MFG
footprint R0603-MFG_No_Silk
footprint R0603-IPC_C_No_Silk
footprint R0603-IPC_B_No_Silk
footprint R0603-IPC_A_No_Silk
pins: 1, 2

## BSS138NH6327
designator Q1M?
Single N-Channel 60 V 3.5 Ohm 1 nC SIPMOS® Small Signal Mosfet - SOT-23; Manufacturer: Infineon; Rds On Max: 3.5R; Continuous Drain Current (ID): 230mA; Max Power Dissipation: 360mW; Input Capacitance: 41pF; Drain to Source Voltage (Vdss): 60V; Turn-Off Delay Time: 6.7ns; Turn-On Delay Time: 2.3ns; Threshold Voltage: 1V; Gate to Source Voltage (Vgs): 20V; Voltage: 50V; Rise Time: 3ns; Fall Time: 8.2ns; Supplier 1: Mouser; Manufacturer Part Number: BSS138NH6327; RoHS: Yes; Stock 1: 795876; Pricing 1: 1=0.37, 10=0.281, 50=0.281, 100=0.159, 1000=0.081, 10000=0.056 (USD); Mounting Technology: Surface Mount; Case/Package: TO-236-3; Pins: 3; Min Operating Temperature: -55°C; Max Operating Temperature: 150°C; Packaging: Tape and Reel; Package Quantity: 3000; Series: SIPMOS®; Length: 2.9mm; Width: 1.3mm; Height: 1mm; RoHS Compliant: Yes; Reach SVHC Compliant: No; Supplier Part Number 1: 726-BSS138NH6327
footprint SOT-23-3-IPC_A
footprint SOT-23-3-IPC_B
footprint SOT-23-3-IPC_C
footprint SOT-23-3-MFG
pins: 1 G, 2 S, 3 D
text: TYPE-N

## ESP8266 ESP-12-F
designator IC1E?
footprint ESP8266 ESP-12-Small (ESP-12 Wi-Fi Module by AI-Thinker)
footprint ESP8266 ESP-12-Medium (ESP-12 Wi-Fi Module by AI-Thinker)
footprint ESP8266 ESP-12-Large (ESP8266 ESP-12-F)
pins: 1 ~{RST} "Reset", 2 ADC/TOUT "ADC Input Or TOUT Output", 3 EN "Chip enable", 4 GPIO16(D0)/~{WAKE} "GPIO16 or Deep-Sleep Wakeup", 5 GPIO14(D5)/HSPICLK "GPIO14 or SPI CLK", 6 GPIO12(D6)/HSPIQ "GPIO12 or SPIQ", 7 GPIO13(D7)/HSPID/CTS0/RXD2 "GPIO13 or SPID", 8 VDD "Power supply", 9 GPIO11/SPI_MOSI/SD_CMD "GPIO11 or CS or SDCMD", 10 GPIO7/SPI_MISO/SD_D0 "GPIO7 or MISO or SDD0", 11 GPIO9/SD_D2 "GPIO09 or SDD2", 12 GPIO10/SPI_CS/SD_D3 "GPIO10 or SDD3", 13 GPIO8/SPI_INT/SD_D1 "GPIO8 or MOSI or SDD1", 14 GPIO6/SPI_CLK/SD_CLK "GPIO6 or SCLK or SDCLK", 15 GND "Power ground", 16 GPIO15(D8)/HSPICS/RTS0/TXD2 "GPIO15 or SPICS", 17 GPIO2(D4)/TXD1 "GPIO2 or TX", 18 GPIO0(D3)/SPICS2 "GPIO0 or SPICS2", 19 GPIO4(D2)/SDA "GPIO5", 20 GPIO5(D1)/SCL "GPIO4", 21 GPIO3(RX)/RXD0 "GPIO3 or UART RXD", 22 GPIO1(TX)/SPICS1/TXD0 "GPIO1 or UART TXD"

## EVP-AWED4A
designator SW2K?
3.0MM X 2.0MM / 3.3N / 0.15MM ST; Manufacturer: Panasonic Electronic Components; Actuator Height off PCB, Vertical: 0.60mm; Actuator Orientation: Top Actuated; Actuator Type: Standard; Circuit: SPST-NO; Contact Rating @ Voltage: 0.02A @ 15VDC; Illumination: Non-Illuminated; Ingress Protection: IP67 - Dust Tight, Waterproof; Operating Force: 330gf; Outline: 3.00mm x 2.00mm; Switch Function: Off-Mom; Part Number: EVP-AWED4A; ComponentLink1Description: Datasheet; ComponentLink1URL: https://industrial.panasonic.com/ac/cdn/e/control/switch/light-touch/catalog/sw_lt_eng_3020s.pdf; ComponentLink2Description: DigiKey Link; ComponentLink2URL: https://www.digikey.com/en/products/detail/panasonic-electronic-components/EVP-AWED4A/8568275; LastUpdated: 03-06-2024 20:19:31; Lifecycle Status: Active; Minimum Order: 1; Mounting Type: Surface Mount; Operating Temperature: -40°C ~ 85°C; Packaging: TapeAndReel; Part Status: Active; Price: 0.16; Series: EVPAW; Supplier 1: DigiKey; Supplier Part Number 1: P123440CT-ND; Termination Style: SMD (SMT) Tab
footprint PANASONIC EVPAW
pins: 1, 2

## Front_Pannel_2x05_P2.54mm
designator J1F?, comment 2X05
footprint Front_Pannel_2x05_P2.54mm_Horizontal_Left
footprint Front_Pannel_2x05_P2.54mm_Horizontal_Right
footprint Front_Pannel_2x05_P2.54mm_Vertical
footprint Front_Pannel_2x05_P2.54mm_Vertical_SMD
pins: 1 HDD_LED+, 2 PWR_LED+, 3 HDD_LED- (IED_LED), 4 PWR_LED- (SUS_LED), 5 RST_SW- (GND), 6 PWR_SW+, 7 RST_SW+, 8 PWR_SW- (GND), 9 NC (+5VDC)

## FUSE_PPTC_0603
designator F1P?, comment F0603  value 500mA
Fuse PPTC SMD 0603; Manufacturer: *; Manufacturer Part Number: *
footprint R0603-IPC_A
footprint R0603-IPC_A_No_Silk
footprint R0603-IPC_B
footprint R0603-IPC_B_No_Silk
footprint R0603-IPC_C
footprint R0603-IPC_C_No_Silk
footprint R0603-MFG
footprint R0603-MFG_No_Silk
pins: 1, 2
text: PTC

## FUSE_PPTC_0603_1
designator F1U?, comment F0603  value 300mA
Fuse PPTC SMD 0603; Manufacturer: *; Manufacturer Part Number: *
footprint R0603-IPC_A
footprint R0603-IPC_A_No_Silk
footprint R0603-IPC_B
footprint R0603-IPC_B_No_Silk
footprint R0603-IPC_C
footprint R0603-IPC_C_No_Silk
footprint R0603-MFG
footprint R0603-MFG_No_Silk
pins: 1, 2
text: PTC

## I2C_2X04_P2.54mm
designator J1I?, comment 2X04
footprint PinHeader_2x04_P2.54mm_Horizontal
footprint PinHeader_2x04_P2.54mm_Vertical
footprint PinHeader_2x04_P2.54mm_Vertical_SMD
pins: 1 GND, 2 GND, 3 VCC, 4 VCC, 5 SCL, 6 SDA, 7 SDA, 8 SCL

## LED_0603_YELLOW
designator D1L?, comment YELLOW
LED 0603 YELLOW SMD
footprint LED_0603_YELLOW
pins: 1 K, 2 A

## MM3Z12VST1G
designator ZD1P?
MM3Z12VST1G Zener Diode, 12V 2% 200 mW SMT 2-Pin SOD-323 | ON Semiconductor MM3Z12VST1G; Max Power Dissipation: 300mW; Impedance: 25R; Power Dissipation: 200mW; Max Reverse Leakage Current: 100nA; Test Current: 5mA; Forward Voltage: 900mV; Zener Current: 10mA; Supplier 1: Onlinecomponents.com; Supplier Part Number 1: MM3Z12VST1G; Manufacturer: ON Semiconductor; Manufacturer Part Number: MM3Z12VST1G; RoHS: Yes; Category: Zener Diodes; Stock 1: 60000; Pricing 1: 3000=0.0152, 6000=0.0145, 9000=0.0143, 27000=0.0137, 51000=0.0133, 102000=0.0128, 252000=0.0125, 501000=0.0123 (USD); Case/Package: SOD-323-2; Min Operating Temperature: -65°C; Max Operating Temperature: 150°C; Packaging: Tape and Reel; Package Quantity: 3000; Zener Voltage: 12V; Voltage Tolerance: 2%; Tolerance: 2%; Series: -; RoHS Compliant: Yes; ComponentLink1URL: https://datasheet.ciiva.com/30478/0900766b8127c8bd-30478408.pdf?src-supplier=Rs; ComponentLink1Description: https://datasheet.ciiva.com/30478/0900766b8127c8bd-30478408.pdf?src-supplier=Rs; ComponentLink2URL: https://datasheet.ciiva.com/16292/mm3z12vst1g-16292931.pdf?src-supplier=Future+Electronics; ComponentLink2Description: https://datasheet.ciiva.com/16292/mm3z12vst1g-16292931.pdf?src-supplier=Future+Electronics; ComponentLink3URL: https://datasheet.ciiva.com/22626/1878251-22626885.pdf?src-supplier=Element14; ComponentLink3Description: https://datasheet.ciiva.com/22626/1878251-22626885.pdf?src-supplier=Element14; Pins: 2; Material: Plastic; Working Voltage: 12V; Max Reverse Current: 100nA; Voltage Rating (DC): 12V; Power Rating: 200mW; Length: 1.8mm; Width: 1.35mm; Height: 1mm; Radiation Hardening: No; Lead Free: Lead Free; Reach SVHC Compliant: No; ComponentLink4URL: https://datasheet.ciiva.com/894/mm3z2v4st1-d-894650.pdf?src-supplier=Digikey; ComponentLink4Description: https://datasheet.ciiva.com/894/mm3z2v4st1-d-894650.pdf?src-supplier=Digikey; ComponentLink5URL: https://datasheet.ciiva.com/894/mm3z2v4st1-d-894651.pdf?src-supplier=Digikey; ComponentLink5Description: https://datasheet.ciiva.com/894/mm3z2v4st1-d-894651.pdf?src-supplier=Digikey; ComponentLink6URL: https://datasheet.ciiva.com/894/mm3z2v4st1-d-894649.pdf?src-supplier=Digikey; ComponentLink6Description: https://datasheet.ciiva.com/894/mm3z2v4st1-d-894649.pdf?src-supplier=Digikey
footprint SOD-323 (SOD, 2-Leads, Body 1.25x2.50mm, IPC Medium Density)
footprint SOD-323F (SODFL, 2-Leads, Body 1.25x2.50mm, IPC Medium Density)
pins: 1 C, 2 A

## MountingHole_Pad_3.2mm
designator H1H?, comment 3.2 mm
ki_keywords: mounting hole; ki_description: Mounting Hole with connection; ki_fp_filters: MountingHole*Pad*; Supplier: ~; Value: 3.2 mm
footprint MountingHole_3.2mm_M3_DIN965_Pad
footprint MountingHole_3.2mm_M3_DIN965_Pad_TopBottom
footprint MountingHole_3.2mm_M3_ISO14580_Pad_TopOnly
footprint MountingHole_3.2mm_M3_ISO14580_Pad
footprint MountingHole_3.2mm_M3_DIN965_Pad_TopOnly
footprint MountingHole_3.2mm_M3_ISO14580_Pad_TopBottom
footprint MountingHole_3.2mm_M3_Pad
footprint MountingHole_3.2mm_M3_Pad_TopBottom
footprint MountingHole_3.2mm_M3_Pad_TopOnly
footprint MountingHole_3.2mm_M3_Pad_Via
footprint MountingHole_3.2mm_M3_ISO7380_Pad
footprint MountingHole_3.2mm_M3_ISO7380_Pad_TopBottom
footprint MountingHole_3.2mm_M3_ISO7380_Pad_TopOnly
footprint MountingHole_3.2mm_M3_Pad_Via_Mask
pins: 1

## PMPB14XPZ
designator Q1P?
Manufacturer: Nexperia; Supplier 1: Element14; Supplier Part Number 1: 4177131; Manufacturer Part Number: PMPB14XPZ; RoHS: No; Stock 1: 3000
footprint DFN2020MD-MFG
pins: 1-2-5-6-7 D, 3 G, 4-8 S
text: TYPE-P

## SGM2019-ADJYN5G/TR
designator U1L?
LDO U-Reg Adj 0, 3A SOT23-5; Manufacturer: SG Micro; Supplier 1: Sourcengine; Supplier Part Number 1: SGM2019-ADJYN5GTR-112944978; Manufacturer Part Number: SGM2019-ADJYN5G/TR; RoHS: No; Category: LDO; Stock 1: 6915
footprint TSOT-23-5-IPC-A (SOT23, 5-Leads, Body 2.90x1.63mm, Pitch 0.95mm, IPC Low Density)
footprint TSOT-23-5-IPC-B (SOT23, 5-Leads, Body 2.90x1.63mm, Pitch 0.95mm, IPC Medium Density)
footprint TSOT-23-5-IPC-C (SOT23, 5-Leads, Body 2.90x1.63mm, Pitch 0.95mm, IPC High Density)
pins: 1 VIN (power), 2 GND (power), 3 EN, 4 BP/FB, 5 OUT (power)

## SRV05-4
designator D1F?, comment CDSOT23-SRV05-4
TVS DIODE 5V 15V SOT23-6; Manufacturer: Bourns Inc.; Standoff Height: 0.2mm; Direction: Bidirectional; Peak Pulse Power: 500W; Max Junction Temp: +150°C; Number Of Channels: 4; Breakdown Voltage: 6V; Peak Pulse Current: 30A; Temperature Range High: +150°C; RoHS: TRUE; Category: Diode; Clamping Voltage: 15V; Reverse Standoff Voltage: 5V; Manufacturer Part Number: CDSOT23-SRV05-4; Octopart: https://octopart.com/cdsot23-srv05-4-bourns-1679449; Automotive: No; ComponentLink2URL: https://www.bourns.com/docs/Product-Datasheets/CDSOT23-SRV05-4.pdf; Device Class L1: Circuit Protection; Temperature: -55°C to +150°C; Device Class L2: TVS Diodes; Temperature Range Low: -55°C; Lead Free: Yes; Device Class L3: unset; Height: 1.45mm; Package: CDSOT23-SRV05-4; Ipc Land Pattern Name: SOT95P280X118-6; Mouser Description: CDSOT23-SRV05-4, Quad Uni-Directional TVS Diode, 500W, 6-Pin SOT-23; ComponentLink2Description: Datasheet; Digikey Description: TVS DIODE 5V 15V SOT23-6
footprint SOT23-6-IPC_A
footprint SOT23-6-IPC_B
footprint SOT23-6-IPC_C
footprint SOT23-6-MFG
pins: 1 I/O 1 (io), 2 GND (power), 3 I/O 2 (io), 4 I/O 3 (io), 5 VBUS (power), 6 I/O 4 (io)

## UART_1X06_P2.54mm_2
designator J1U?, comment 1x06
footprint PinHeader_1x06_P2.54mm_Horizontal
footprint PinHeader_1x06_P2.54mm_Vertical
footprint PinHeader_1x06_P2.54mm_Vertical_SMD_Pin1Left
footprint PinHeader_1x06_P2.54mm_Vertical_SMD_Pin1Right
footprint PinHeader_1x06_P2.54mm_Horizontal_No_3D
footprint PinHeader_1x06_P2.54mm_Vertical_No_3D
footprint PinHeader_1x06_P2.54mm_Vertical_SMD_Pin1Left_No_3D
footprint PinHeader_1x06_P2.54mm_Vertical_SMD_Pin1Right_No_3D
pins: 1 GND, 2 RXD, 3 TXD, 4 RTS, 5 DTR, 6 VCC

## UART_TX_RX_0603
designator RXTX1U?, comment value 470R  Tol: 1%  Package: 0603  (hidden comment: UART_TX_RX)
UART RX/TX Pokayoke; Type: Jumper-Swap
footprint UART_TX_RX_0603
pins: 1 TX#, 2 RX, 3 RX#, 4 TX
text: Ex. 0 Ohm R / 0603 / 2 Units /

## USB-Type-C-6-Pin-SMT
designator J1C?, comment 217175-0001
Connector USB Type C Female 6Positions 0.5mm Right Angle SMT Embossed T/R - Tape and Reel; Manufacturer_Name: Molex; Geometry.Height: 3.46mm; Mouser Part Number: 538-217175-0001; Mouser Price/Stock: https://www.mouser.co.uk/ProductDetail/Molex/217175-0001?qs=DRkmTr78QARWJMiqNnldSg%3D%3D; Manufacturer_Part_Number: 217175-0001; Datasheet Link: https://www.molex.com/pdm_docs/sd/2171750001_sd.pdf
footprint USB-Type-C-6-Pin-SMT (FP-217175-0001-MFG)
pins: A5 CC1, A9 VBUS_1, A12 GND_1, B5 CC2, B9 VBUS_2, B12 GND_2, MH1, MH2, MH3, MH4

## USB_Front_Pannel_2x05_P2.54mm
designator J2C?, comment 2.54 Pitch
footprint USB_Front_Pannel_2x05_P2.54mm_Vertical
footprint USB_Front_Pannel_2x05_P2.54mm_Vertical_SMD
footprint USB_Front_Pannel_2x05_P2.54mm_Horizontal_Left
footprint USB_Front_Pannel_2x05_P2.54mm_Horizontal_Right
pins: 1 +5V, 2 +5V, 3 D-, 4 D-, 5 D+, 6 D+, 7 GND, 8 GND, 10 NC